# Altium schematic symbol library Блоки трансформаторов импульсных.SCHLIB: 325 symbols (part 1 of 2) (continued)
## БТИ5-19 (continued)
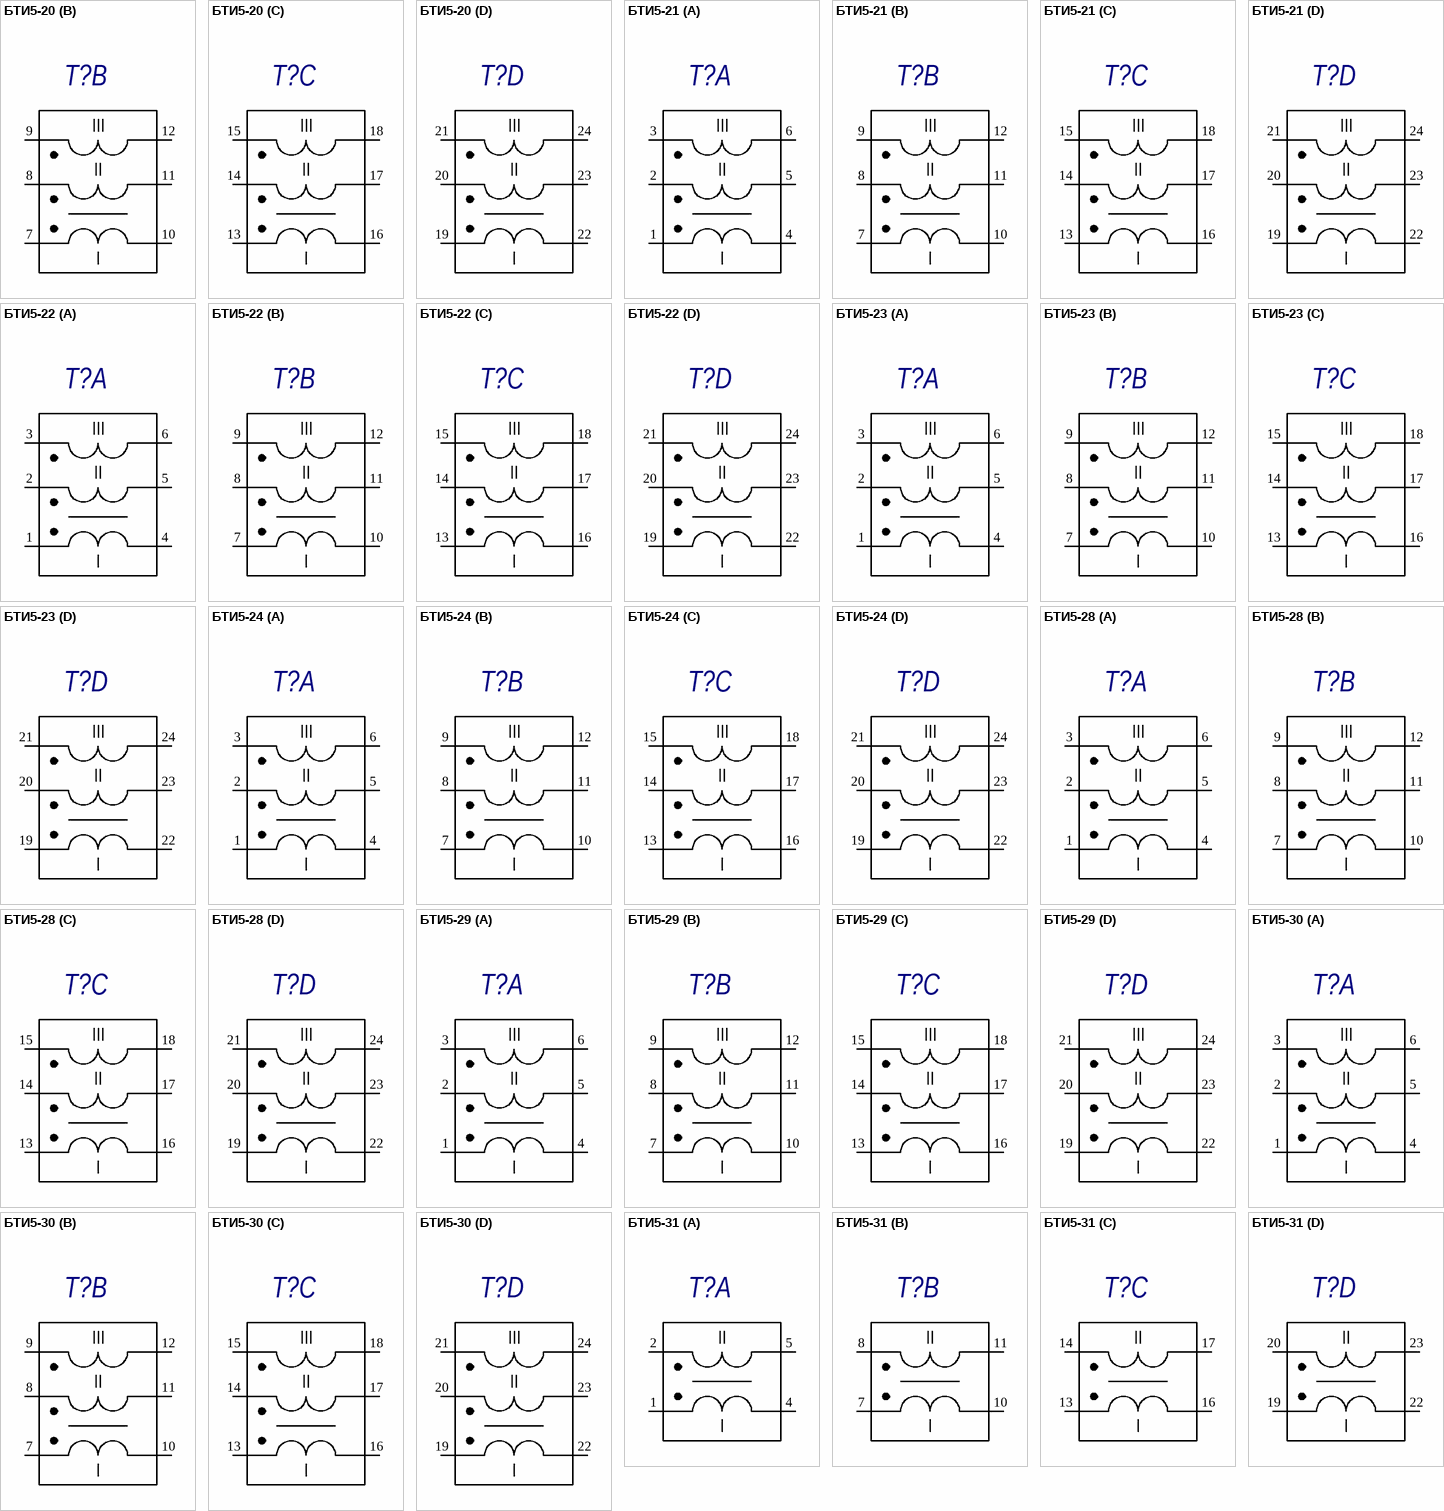
[diagram p14: symbols БТИ5-20 to БТИ5-31]
part A text: III; II; I
part B text: III; II; I
part C text: III; II; I
part D text: III; II; I

## БТИ5-20
designator T?
БТИ5; Manufacturer: ПАО  «МСТАТОР»; ManufacturerCountry: Россия; Value: {Value}; Наименование элемента: Дроссель; Category: Трансформатор; ComponentLink1Description: Manufacturer Link
footprint БТИ5
part A pins: 1, 2, 3, 4, 5, 6
part B pins: 7, 8, 9, 10, 11, 12
part C pins: 13, 14, 15, 16, 17, 18
part D pins: 19, 20, 21, 22, 23, 24
part A text: III; II; I
part B text: III; II; I
part C text: III; II; I
part D text: III; II; I

## БТИ5-21
designator T?
БТИ5; Manufacturer: ПАО  «МСТАТОР»; ManufacturerCountry: Россия; Value: {Value}; Наименование элемента: Дроссель; Category: Трансформатор; ComponentLink1Description: Manufacturer Link
footprint БТИ5
part A pins: 1, 2, 3, 4, 5, 6
part B pins: 7, 8, 9, 10, 11, 12
part C pins: 13, 14, 15, 16, 17, 18
part D pins: 19, 20, 21, 22, 23, 24
part A text: III; II; I
part B text: III; II; I
part C text: III; II; I
part D text: III; II; I

## БТИ5-22
designator T?
БТИ5; Manufacturer: ПАО  «МСТАТОР»; ManufacturerCountry: Россия; Value: {Value}; Наименование элемента: Дроссель; Category: Трансформатор; ComponentLink1Description: Manufacturer Link
footprint БТИ5
part A pins: 1, 2, 3, 4, 5, 6
part B pins: 7, 8, 9, 10, 11, 12
part C pins: 13, 14, 15, 16, 17, 18
part D pins: 19, 20, 21, 22, 23, 24
part A text: III; II; I
part B text: III; II; I
part C text: III; II; I
part D text: III; II; I

## БТИ5-23
designator T?
БТИ5; Manufacturer: ПАО  «МСТАТОР»; ManufacturerCountry: Россия; Value: {Value}; Наименование элемента: Дроссель; Category: Трансформатор; ComponentLink1Description: Manufacturer Link
footprint БТИ5
part A pins: 1, 2, 3, 4, 5, 6
part B pins: 7, 8, 9, 10, 11, 12
part C pins: 13, 14, 15, 16, 17, 18
part D pins: 19, 20, 21, 22, 23, 24
part A text: III; II; I
part B text: III; II; I
part C text: III; II; I
part D text: III; II; I

## БТИ5-24
designator T?
БТИ5; Manufacturer: ПАО  «МСТАТОР»; ManufacturerCountry: Россия; Value: {Value}; Наименование элемента: Дроссель; Category: Трансформатор; ComponentLink1Description: Manufacturer Link
footprint БТИ5
part A pins: 1, 2, 3, 4, 5, 6
part B pins: 7, 8, 9, 10, 11, 12
part C pins: 13, 14, 15, 16, 17, 18
part D pins: 19, 20, 21, 22, 23, 24
part A text: III; II; I
part B text: III; II; I
part C text: III; II; I
part D text: III; II; I

## БТИ5-28
designator T?
БТИ5; Manufacturer: ПАО  «МСТАТОР»; ManufacturerCountry: Россия; Value: {Value}; Наименование элемента: Дроссель; Category: Трансформатор; ComponentLink1Description: Manufacturer Link
footprint БТИ5
part A pins: 1, 2, 3, 4, 5, 6
part B pins: 7, 8, 9, 10, 11, 12
part C pins: 13, 14, 15, 16, 17, 18
part D pins: 19, 20, 21, 22, 23, 24
part A text: III; II; I
part B text: III; II; I
part C text: III; II; I
part D text: III; II; I

## БТИ5-29
designator T?
БТИ5; Manufacturer: ПАО  «МСТАТОР»; ManufacturerCountry: Россия; Value: {Value}; Наименование элемента: Дроссель; Category: Трансформатор; ComponentLink1Description: Manufacturer Link
footprint БТИ5
part A pins: 1, 2, 3, 4, 5, 6
part B pins: 7, 8, 9, 10, 11, 12
part C pins: 13, 14, 15, 16, 17, 18
part D pins: 19, 20, 21, 22, 23, 24
part A text: III; II; I
part B text: III; II; I
part C text: III; II; I
part D text: III; II; I

## БТИ5-30
designator T?
БТИ5; Manufacturer: ПАО  «МСТАТОР»; ManufacturerCountry: Россия; Value: {Value}; Наименование элемента: Дроссель; Category: Трансформатор; ComponentLink1Description: Manufacturer Link
footprint БТИ5
part A pins: 1, 2, 3, 4, 5, 6
part B pins: 7, 8, 9, 10, 11, 12
part C pins: 13, 14, 15, 16, 17, 18
part D pins: 19, 20, 21, 22, 23, 24
part A text: III; II; I
part B text: III; II; I
part C text: III; II; I
part D text: III; II; I

## БТИ5-31
designator T?
БТИ5; Manufacturer: ПАО  «МСТАТОР»; ManufacturerCountry: Россия; Value: {Value}; Наименование элемента: Дроссель; Category: Трансформатор; ComponentLink1Description: Manufacturer Link
footprint БТИ5
part A pins: 1, 2, 4, 5
part B pins: 7, 8, 10, 11
part C pins: 13, 14, 16, 17
part D pins: 19, 20, 22, 23
part A text: II; I
part B text: II; I
part C text: II; I
part D text: II; I

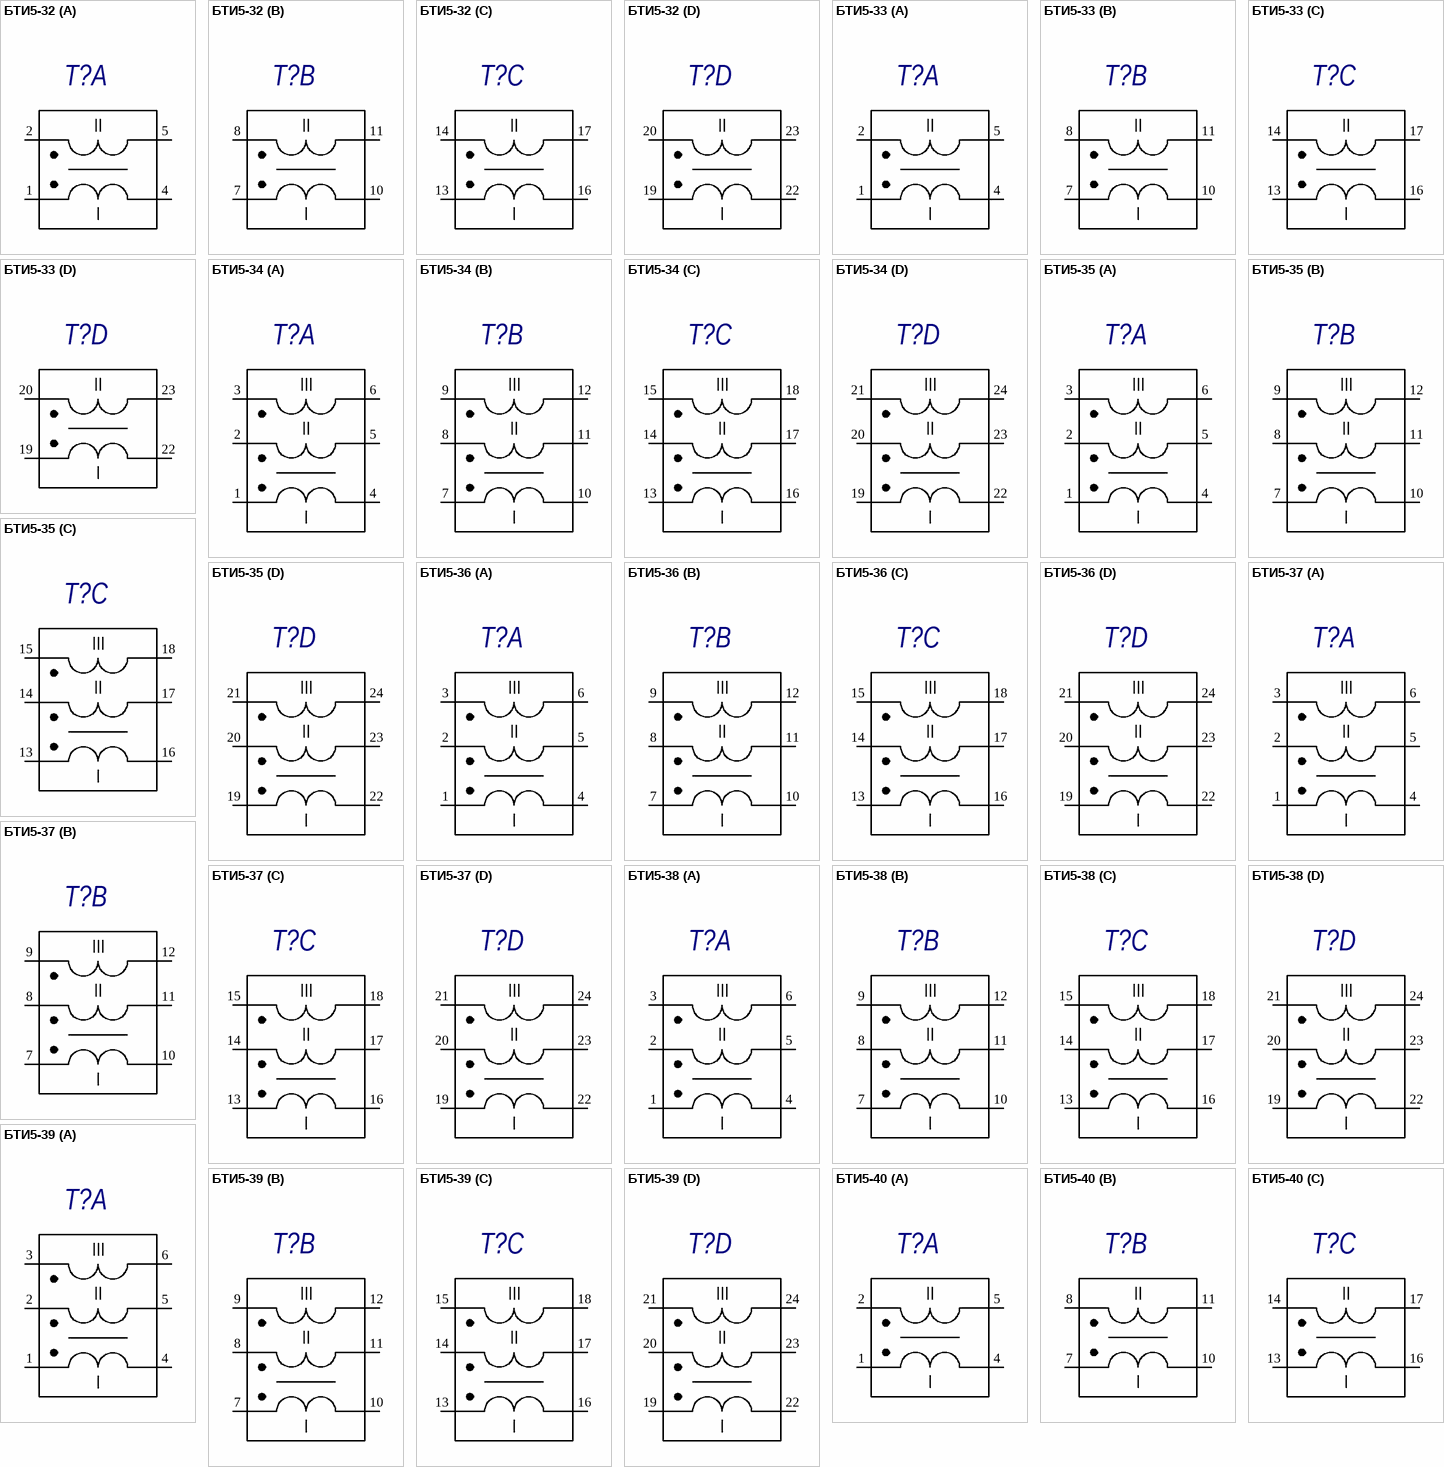
[diagram p15: symbols БТИ5-32 to БТИ5-40]

## БТИ5-32
designator T?
БТИ5; Manufacturer: ПАО  «МСТАТОР»; ManufacturerCountry: Россия; Value: {Value}; Наименование элемента: Дроссель; Category: Трансформатор; ComponentLink1Description: Manufacturer Link
footprint БТИ5
part A pins: 1, 2, 4, 5
part B pins: 7, 8, 10, 11
part C pins: 13, 14, 16, 17
part D pins: 19, 20, 22, 23
part A text: II; I
part B text: II; I
part C text: II; I
part D text: II; I

## БТИ5-33
designator T?
БТИ5; Manufacturer: ПАО  «МСТАТОР»; ManufacturerCountry: Россия; Value: {Value}; Наименование элемента: Дроссель; Category: Трансформатор; ComponentLink1Description: Manufacturer Link
footprint БТИ5
part A pins: 1, 2, 4, 5
part B pins: 7, 8, 10, 11
part C pins: 13, 14, 16, 17
part D pins: 19, 20, 22, 23
part A text: II; I
part B text: II; I
part C text: II; I
part D text: II; I

## БТИ5-34
designator T?
БТИ5; Manufacturer: ПАО  «МСТАТОР»; ManufacturerCountry: Россия; Value: {Value}; Наименование элемента: Дроссель; Category: Трансформатор; ComponentLink1Description: Manufacturer Link
footprint БТИ5
part A pins: 1, 2, 3, 4, 5, 6
part B pins: 7, 8, 9, 10, 11, 12
part C pins: 13, 14, 15, 16, 17, 18
part D pins: 19, 20, 21, 22, 23, 24
part A text: III; II; I
part B text: III; II; I
part C text: III; II; I
part D text: III; II; I

## БТИ5-35
designator T?
БТИ5; Manufacturer: ПАО  «МСТАТОР»; ManufacturerCountry: Россия; Value: {Value}; Наименование элемента: Дроссель; Category: Трансформатор; ComponentLink1Description: Manufacturer Link
footprint БТИ5
part A pins: 1, 2, 3, 4, 5, 6
part B pins: 7, 8, 9, 10, 11, 12
part C pins: 13, 14, 15, 16, 17, 18
part D pins: 19, 20, 21, 22, 23, 24
part A text: III; II; I
part B text: III; II; I
part C text: III; II; I
part D text: III; II; I

## БТИ5-36
designator T?
БТИ5; Manufacturer: ПАО  «МСТАТОР»; ManufacturerCountry: Россия; Value: {Value}; Наименование элемента: Дроссель; Category: Трансформатор; ComponentLink1Description: Manufacturer Link
footprint БТИ5
part A pins: 1, 2, 3, 4, 5, 6
part B pins: 7, 8, 9, 10, 11, 12
part C pins: 13, 14, 15, 16, 17, 18
part D pins: 19, 20, 21, 22, 23, 24
part A text: III; II; I
part B text: III; II; I
part C text: III; II; I
part D text: III; II; I

## БТИ5-37
designator T?
БТИ5; Manufacturer: ПАО  «МСТАТОР»; ManufacturerCountry: Россия; Value: {Value}; Наименование элемента: Дроссель; Category: Трансформатор; ComponentLink1Description: Manufacturer Link
footprint БТИ5
part A pins: 1, 2, 3, 4, 5, 6
part B pins: 7, 8, 9, 10, 11, 12
part C pins: 13, 14, 15, 16, 17, 18
part D pins: 19, 20, 21, 22, 23, 24
part A text: III; II; I
part B text: III; II; I
part C text: III; II; I
part D text: III; II; I

## БТИ5-38
designator T?
БТИ5; Manufacturer: ПАО  «МСТАТОР»; ManufacturerCountry: Россия; Value: {Value}; Наименование элемента: Дроссель; Category: Трансформатор; ComponentLink1Description: Manufacturer Link
footprint БТИ5
part A pins: 1, 2, 3, 4, 5, 6
part B pins: 7, 8, 9, 10, 11, 12
part C pins: 13, 14, 15, 16, 17, 18
part D pins: 19, 20, 21, 22, 23, 24
part A text: III; II; I
part B text: III; II; I
part C text: III; II; I
part D text: III; II; I

## БТИ5-39
designator T?
БТИ5; Manufacturer: ПАО  «МСТАТОР»; ManufacturerCountry: Россия; Value: {Value}; Наименование элемента: Дроссель; Category: Трансформатор; ComponentLink1Description: Manufacturer Link
footprint БТИ5
part A pins: 1, 2, 3, 4, 5, 6
part B pins: 7, 8, 9, 10, 11, 12
part C pins: 13, 14, 15, 16, 17, 18
part D pins: 19, 20, 21, 22, 23, 24
part A text: III; II; I
part B text: III; II; I
part C text: III; II; I
part D text: III; II; I

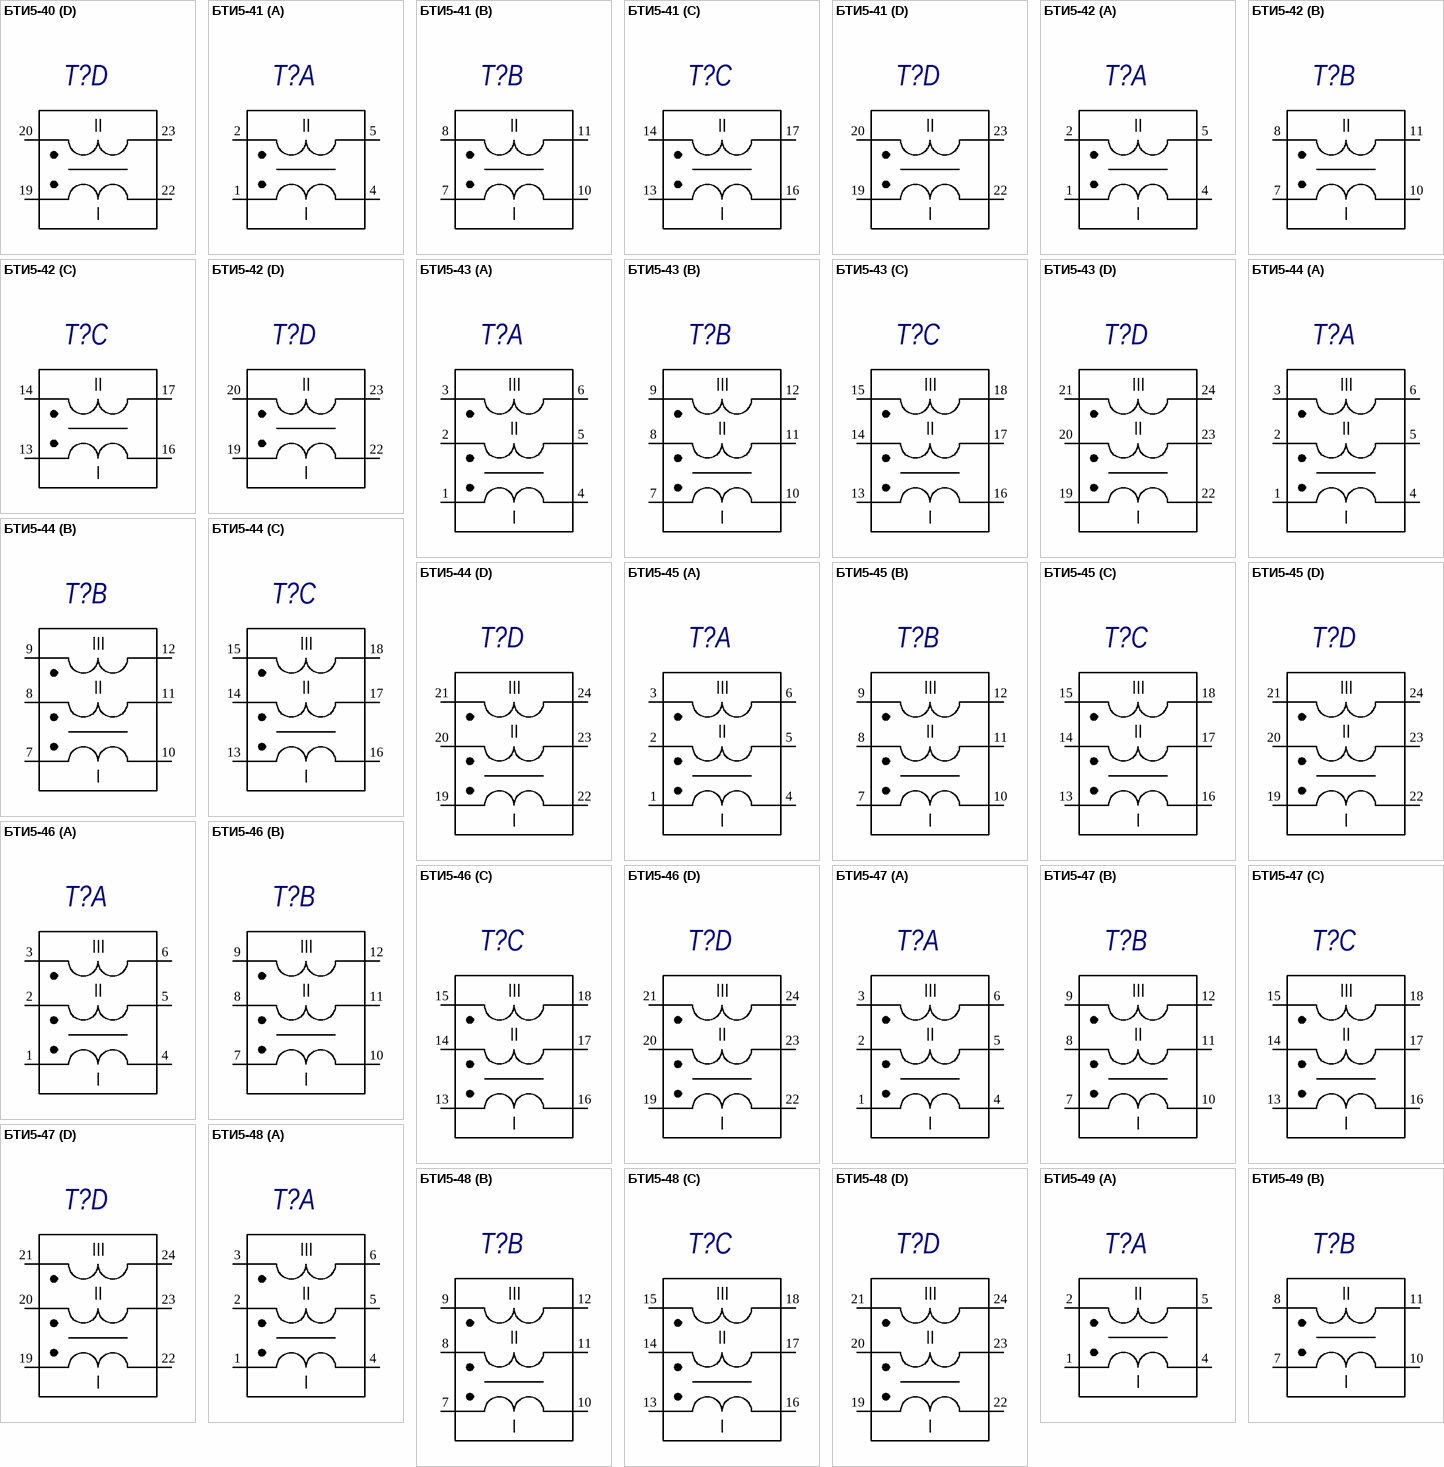
[diagram p16: symbols БТИ5-40 to БТИ5-49]

## БТИ5-40
designator T?
БТИ5; Manufacturer: ПАО  «МСТАТОР»; ManufacturerCountry: Россия; Value: {Value}; Наименование элемента: Дроссель; Category: Трансформатор; ComponentLink1Description: Manufacturer Link
footprint БТИ5
part A pins: 1, 2, 4, 5
part B pins: 7, 8, 10, 11
part C pins: 13, 14, 16, 17
part D pins: 19, 20, 22, 23
part A text: II; I
part B text: II; I
part C text: II; I
part D text: II; I

## БТИ5-41
designator T?
БТИ5; Manufacturer: ПАО  «МСТАТОР»; ManufacturerCountry: Россия; Value: {Value}; Наименование элемента: Дроссель; Category: Трансформатор; ComponentLink1Description: Manufacturer Link
footprint БТИ5
part A pins: 1, 2, 4, 5
part B pins: 7, 8, 10, 11
part C pins: 13, 14, 16, 17
part D pins: 19, 20, 22, 23
part A text: II; I
part B text: II; I
part C text: II; I
part D text: II; I

## БТИ5-42
designator T?
БТИ5; Manufacturer: ПАО  «МСТАТОР»; ManufacturerCountry: Россия; Value: {Value}; Наименование элемента: Дроссель; Category: Трансформатор; ComponentLink1Description: Manufacturer Link
footprint БТИ5
part A pins: 1, 2, 4, 5
part B pins: 7, 8, 10, 11
part C pins: 13, 14, 16, 17
part D pins: 19, 20, 22, 23
part A text: II; I
part B text: II; I
part C text: II; I
part D text: II; I

## БТИ5-43
designator T?
БТИ5; Manufacturer: ПАО  «МСТАТОР»; ManufacturerCountry: Россия; Value: {Value}; Наименование элемента: Дроссель; Category: Трансформатор; ComponentLink1Description: Manufacturer Link
footprint БТИ5
part A pins: 1, 2, 3, 4, 5, 6
part B pins: 7, 8, 9, 10, 11, 12
part C pins: 13, 14, 15, 16, 17, 18
part D pins: 19, 20, 21, 22, 23, 24
part A text: III; II; I
part B text: III; II; I
part C text: III; II; I
part D text: III; II; I

## БТИ5-44
designator T?
БТИ5; Manufacturer: ПАО  «МСТАТОР»; ManufacturerCountry: Россия; Value: {Value}; Наименование элемента: Дроссель; Category: Трансформатор; ComponentLink1Description: Manufacturer Link
footprint БТИ5
part A pins: 1, 2, 3, 4, 5, 6
part B pins: 7, 8, 9, 10, 11, 12
part C pins: 13, 14, 15, 16, 17, 18
part D pins: 19, 20, 21, 22, 23, 24
part A text: III; II; I
part B text: III; II; I
part C text: III; II; I
part D text: III; II; I

## БТИ5-45
designator T?
БТИ5; Manufacturer: ПАО  «МСТАТОР»; ManufacturerCountry: Россия; Value: {Value}; Наименование элемента: Дроссель; Category: Трансформатор; ComponentLink1Description: Manufacturer Link
footprint БТИ5
part A pins: 1, 2, 3, 4, 5, 6
part B pins: 7, 8, 9, 10, 11, 12
part C pins: 13, 14, 15, 16, 17, 18
part D pins: 19, 20, 21, 22, 23, 24
part A text: III; II; I
part B text: III; II; I
part C text: III; II; I
part D text: III; II; I

## БТИ5-46
designator T?
БТИ5; Manufacturer: ПАО  «МСТАТОР»; ManufacturerCountry: Россия; Value: {Value}; Наименование элемента: Дроссель; Category: Трансформатор; ComponentLink1Description: Manufacturer Link
footprint БТИ5
part A pins: 1, 2, 3, 4, 5, 6
part B pins: 7, 8, 9, 10, 11, 12
part C pins: 13, 14, 15, 16, 17, 18
part D pins: 19, 20, 21, 22, 23, 24
part A text: III; II; I
part B text: III; II; I
part C text: III; II; I
part D text: III; II; I

## БТИ5-47
designator T?
БТИ5; Manufacturer: ПАО  «МСТАТОР»; ManufacturerCountry: Россия; Value: {Value}; Наименование элемента: Дроссель; Category: Трансформатор; ComponentLink1Description: Manufacturer Link
footprint БТИ5
part A pins: 1, 2, 3, 4, 5, 6
part B pins: 7, 8, 9, 10, 11, 12
part C pins: 13, 14, 15, 16, 17, 18
part D pins: 19, 20, 21, 22, 23, 24
part A text: III; II; I
part B text: III; II; I
part C text: III; II; I
part D text: III; II; I

## БТИ5-48
designator T?
БТИ5; Manufacturer: ПАО  «МСТАТОР»; ManufacturerCountry: Россия; Value: {Value}; Наименование элемента: Дроссель; Category: Трансформатор; ComponentLink1Description: Manufacturer Link
footprint БТИ5
part A pins: 1, 2, 3, 4, 5, 6
part B pins: 7, 8, 9, 10, 11, 12
part C pins: 13, 14, 15, 16, 17, 18
part D pins: 19, 20, 21, 22, 23, 24
part A text: III; II; I
part B text: III; II; I
part C text: III; II; I
part D text: III; II; I

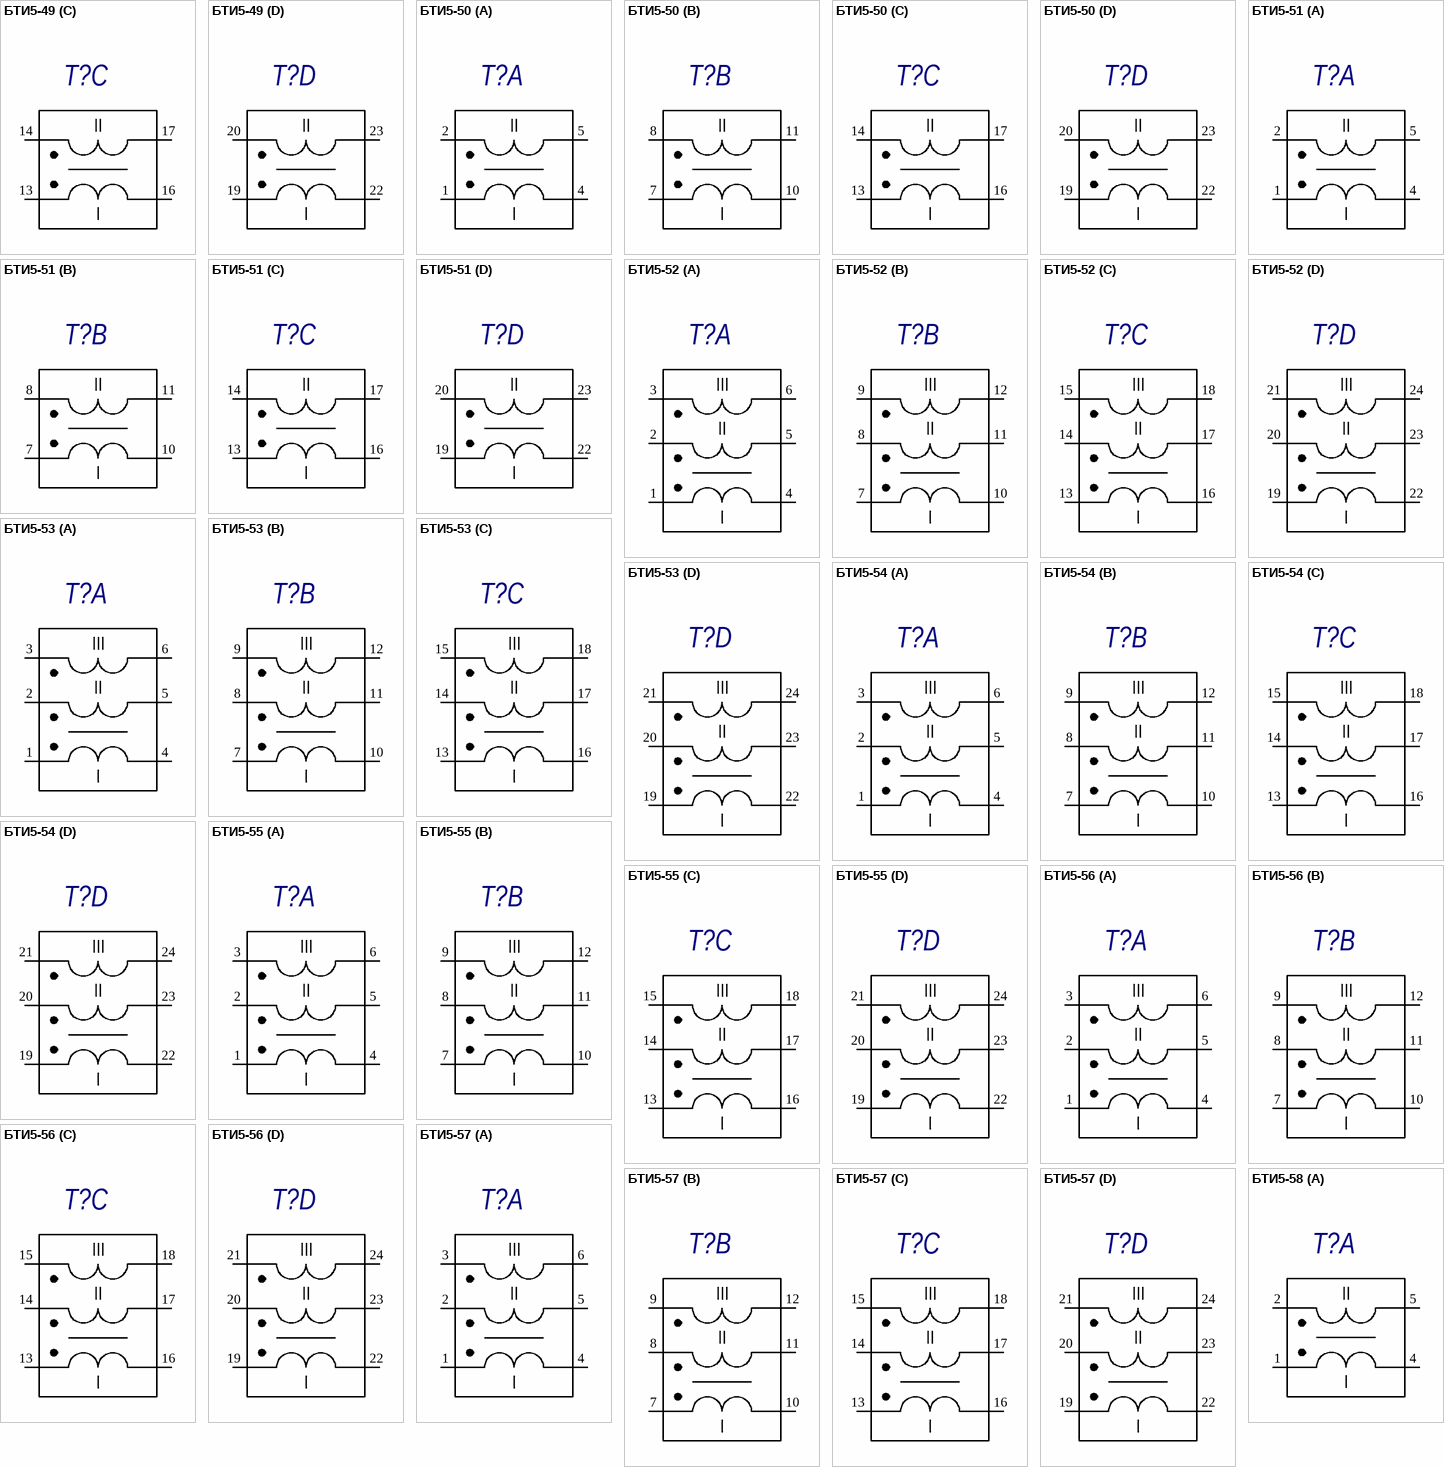
[diagram p17: symbols БТИ5-49 to БТИ5-58]

## БТИ5-49
designator T?
БТИ5; Manufacturer: ПАО  «МСТАТОР»; ManufacturerCountry: Россия; Value: {Value}; Наименование элемента: Дроссель; Category: Трансформатор; ComponentLink1Description: Manufacturer Link
footprint БТИ5
part A pins: 1, 2, 4, 5
part B pins: 7, 8, 10, 11
part C pins: 13, 14, 16, 17
part D pins: 19, 20, 22, 23
part A text: II; I
part B text: II; I
part C text: II; I
part D text: II; I

## БТИ5-50
designator T?
БТИ5; Manufacturer: ПАО  «МСТАТОР»; ManufacturerCountry: Россия; Value: {Value}; Наименование элемента: Дроссель; Category: Трансформатор; ComponentLink1Description: Manufacturer Link
footprint БТИ5
part A pins: 1, 2, 4, 5
part B pins: 7, 8, 10, 11
part C pins: 13, 14, 16, 17
part D pins: 19, 20, 22, 23
part A text: II; I
part B text: II; I
part C text: II; I
part D text: II; I

## БТИ5-51
designator T?
БТИ5; Manufacturer: ПАО  «МСТАТОР»; ManufacturerCountry: Россия; Value: {Value}; Наименование элемента: Дроссель; Category: Трансформатор; ComponentLink1Description: Manufacturer Link
footprint БТИ5
part A pins: 1, 2, 4, 5
part B pins: 7, 8, 10, 11
part C pins: 13, 14, 16, 17
part D pins: 19, 20, 22, 23
part A text: II; I
part B text: II; I
part C text: II; I
part D text: II; I

## БТИ5-52
designator T?
БТИ5; Manufacturer: ПАО  «МСТАТОР»; ManufacturerCountry: Россия; Value: {Value}; Наименование элемента: Дроссель; Category: Трансформатор; ComponentLink1Description: Manufacturer Link
footprint БТИ5
part A pins: 1, 2, 3, 4, 5, 6
part B pins: 7, 8, 9, 10, 11, 12
part C pins: 13, 14, 15, 16, 17, 18
part D pins: 19, 20, 21, 22, 23, 24
part A text: III; II; I
part B text: III; II; I
part C text: III; II; I
part D text: III; II; I

## БТИ5-53
designator T?
БТИ5; Manufacturer: ПАО  «МСТАТОР»; ManufacturerCountry: Россия; Value: {Value}; Наименование элемента: Дроссель; Category: Трансформатор; ComponentLink1Description: Manufacturer Link
footprint БТИ5
part A pins: 1, 2, 3, 4, 5, 6
part B pins: 7, 8, 9, 10, 11, 12
part C pins: 13, 14, 15, 16, 17, 18
part D pins: 19, 20, 21, 22, 23, 24
part A text: III; II; I
part B text: III; II; I
part C text: III; II; I
part D text: III; II; I

## БТИ5-54
designator T?
БТИ5; Manufacturer: ПАО  «МСТАТОР»; ManufacturerCountry: Россия; Value: {Value}; Наименование элемента: Дроссель; Category: Трансформатор; ComponentLink1Description: Manufacturer Link
footprint БТИ5
part A pins: 1, 2, 3, 4, 5, 6
part B pins: 7, 8, 9, 10, 11, 12
part C pins: 13, 14, 15, 16, 17, 18
part D pins: 19, 20, 21, 22, 23, 24
part A text: III; II; I
part B text: III; II; I
part C text: III; II; I
part D text: III; II; I

## БТИ5-55
designator T?
БТИ5; Manufacturer: ПАО  «МСТАТОР»; ManufacturerCountry: Россия; Value: {Value}; Наименование элемента: Дроссель; Category: Трансформатор; ComponentLink1Description: Manufacturer Link
footprint БТИ5
part A pins: 1, 2, 3, 4, 5, 6
part B pins: 7, 8, 9, 10, 11, 12
part C pins: 13, 14, 15, 16, 17, 18
part D pins: 19, 20, 21, 22, 23, 24
part A text: III; II; I
part B text: III; II; I
part C text: III; II; I
part D text: III; II; I

## БТИ5-56
designator T?
БТИ5; Manufacturer: ПАО  «МСТАТОР»; ManufacturerCountry: Россия; Value: {Value}; Наименование элемента: Дроссель; Category: Трансформатор; ComponentLink1Description: Manufacturer Link
footprint БТИ5
part A pins: 1, 2, 3, 4, 5, 6
part B pins: 7, 8, 9, 10, 11, 12
part C pins: 13, 14, 15, 16, 17, 18
part D pins: 19, 20, 21, 22, 23, 24
part A text: III; II; I
part B text: III; II; I
part C text: III; II; I
part D text: III; II; I